# Altium integrated library Diodes.IntLib: 88 symbols
Pins are listed as number, name and electrical type; pins without a type are passive.

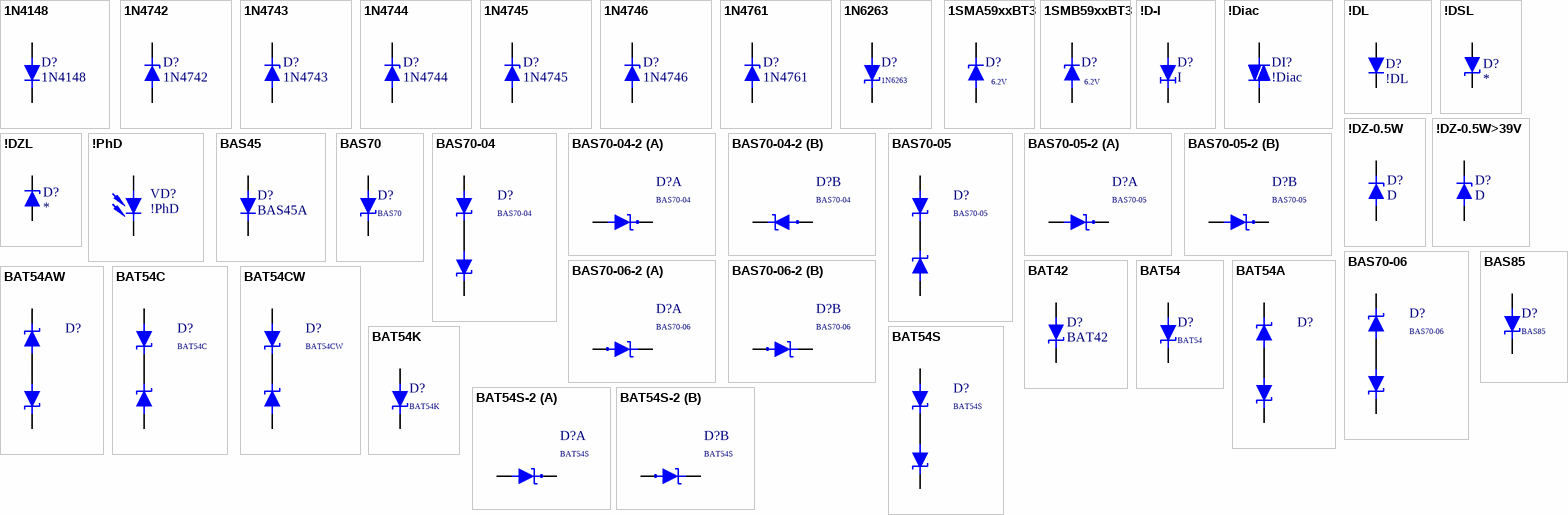
[diagram p0: symbols 1N4148 to BAT54S-2]

## 1N4148
designator D?
DO-35 75V 0.2A 1uS 4A 4nS; Price: 0.02
footprint DO-35-300
simulation model 1N4148 (Model Description)
signal-integrity model D (Model Description)
footprint DO-35-200
pins: 1 A, 2 C
1 alternate drawing of the same symbol

## 1N4742
designator D?
13V 1W; Price: 0.05
footprint DO-41-300
simulation model D1N4742 (Model Description)
signal-integrity model D (Model Description)
pins: 1 A, 2 C
1 alternate drawing of the same symbol

## 1N4743
designator D?
13V 1W; Price: 0.05
footprint DO-41-300
simulation model D1N4743 (Model Description)
signal-integrity model D (Model Description)
pins: 1 A, 2 C
1 alternate drawing of the same symbol

## 1N4744
designator D?
15V 1W; Price: 0.05
footprint DO-41-300
simulation model D1N4744 (Model Description)
signal-integrity model D (Model Description)
pins: 1 A, 2 C
1 alternate drawing of the same symbol

## 1N4745
designator D?
16V 1W; Price: 0.05
footprint DO-41-300
simulation model D1N4745 (Model Description)
signal-integrity model D (Model Description)
pins: 1 A, 2 C
1 alternate drawing of the same symbol

## 1N4746
designator D?
18V 1W; Price: 0.05
footprint DO-41-300
simulation model D1N4746 (Model Description)
signal-integrity model D (Model Description)
pins: 1 A, 2 C
1 alternate drawing of the same symbol

## 1N4761
designator D?
75V 1W; Price: 0.05
footprint DO-41-300
simulation model D1N4746 (Model Description)
signal-integrity model D (Model Description)
pins: 1 A, 2 C
1 alternate drawing of the same symbol

## 1N6263
designator D?
SMD-SOT123 60V 15mA 2.2pF 1nS; Price: 0.07
footprint SOD123
simulation model D1N6263W (Model Description)
signal-integrity model D (Model Description)
pins: 1 A, 2 C
1 alternate drawing of the same symbol

## 1SMA59xxBT3
designator D?, comment value 6.2V  (hidden comment: 1SMA5920BT3)
SMD-SMA 1.5W; Price: 0.08
footprint DO-214AC (SMA) (DO-214-AC/SMA; 2 C-Bend Leads; Body 5 x 2.7 mm, inc. leads (LxW))
signal-integrity model D (Model Description)
pins: 1 A, 2 C
1 alternate drawing of the same symbol

## 1SMB59xxBT3
designator D?, comment value 6.2V  (hidden comment: 1SMB5920BT3)
SMD-SMB 3W; Price: 0.08
footprint DO-214AA (SMB) (DO-214-AA/SMB; 2 C-Bend Leads; Body 5.3 x 3.6 mm, inc. leads (LxW))
signal-integrity model D (Model Description)
pins: 1 A, 2 C
1 alternate drawing of the same symbol

## !D-I
designator D?, comment I
Const I; Price: 0.02
footprint DO-35-300
signal-integrity model D (Model Description)
pins: 1 A, 2 C

## !Diac
designator DI?
*; Price: *
footprint DO-35-300
signal-integrity model D (Model Description)
pins: 1 A1 (hiz), 2 A2

## !DL
designator D?
*; Price: *
footprint DO-35-300
signal-integrity model D (Model Description)
pins: 1 A, 2 C

## !DSL
designator D?
Price: *
footprint DO-35-300
signal-integrity model D (Model Description)
pins: 1 A, 2 C

## !DZ-0.5W
designator D?, comment D
0.5W DO-35; Price: 0.044
footprint DO-35-300
signal-integrity model D (Model Description)
footprint DO-35-200
pins: 1 A, 2 C

## !DZ-0.5W>39V
designator D?, comment D
0.5W DO-35; Price: 0.083
footprint DO-35-300
signal-integrity model D (Model Description)
footprint DO-35-200
pins: 1 A, 2 C

## !DZL
designator D?
Price: *
footprint DO-35-300
signal-integrity model D (Model Description)
footprint DO-35-200
pins: 1 A, 2 C

## !PhD
designator VD?
PhotoDiod; Price: *
signal-integrity model D (Model Description)
pins: 1 A, 2 C
1 alternate drawing of the same symbol

## BAS45
designator D?, comment BAS45A
DO-35 125V 0.225A 4pF 1.5uS 1nA/125V; Price: 0.02
footprint DO-35-300
simulation model BAS45A (Model Description)
signal-integrity model D (Model Description)
footprint DO-35-200
pins: 1 A, 2 C

## BAS70
designator D?
SMD-SOT23 70V 0.2A 5nS; Price: 0.07
footprint SOT23
simulation model BAS70 (Model Description)
signal-integrity model D (Model Description)
pins: 1 A, 3 C
1 alternate drawing of the same symbol

## BAS70-04
designator D?
SMD-SOT23 70V 0.2A 5nS; Price: 0.08
footprint SOT23
simulation model BAS70-04 (Model Description)
signal-integrity model D (Model Description)
pins: 1 A, 2 C, 3 A/C
1 alternate drawing of the same symbol

## BAS70-04-2
designator D?, comment BAS70-04
SMD-SOT23 70V 0.2A 5nS; Price: 0.08
footprint SOT23
simulation model BAS70-04 (Model Description)
signal-integrity model D (Model Description)
part A pins: 1 A, 3 A-C
part B pins: 2 C, 3 A-C

## BAS70-05
designator D?
SMD-SOT23 70V 0.2A 5nS; Price: 0.08
footprint SOT23
simulation model BAS70-05 (Model Description)
signal-integrity model D (Model Description)
pins: 1 A, 2 A, 3 C
2 alternate drawings of the same symbol

## BAS70-05-2
designator D?, comment BAS70-05
SMD-SOT23 70V 0.2A 5nS; Price: 0.08
footprint SOT23
simulation model BAS70-05 (Model Description)
signal-integrity model D (Model Description)
part A pins: 1 A, 3 C
part B pins: 2 A, 3 C

## BAS70-06
designator D?
SMD-SOT23 70V 0.2A 5nS 5nA/70V; Price: 0.08
footprint SOT23
simulation model BAS70-06 (Model Description)
signal-integrity model D (Model Description)
pins: 1 C, 2 C, 3 A
1 alternate drawing of the same symbol

## BAS70-06-2
designator D?, comment BAS70-06
SMD-SOT23 70V 0.2A 5nS; Price: 0.08
footprint SOT23
simulation model BAS70-06 (Model Description)
signal-integrity model D (Model Description)
part A pins: 1 C, 3 A
part B pins: 2 C, 3 A

## BAS85
designator D?
SMD-SOT23 30V 0.2A 5nS; Price: 0.08
footprint SOD80/MLL34
simulation model BAT85 (Model Description)
signal-integrity model D (Model Description)
pins: 1 A, 2 C
1 alternate drawing of the same symbol

## BAT42
designator D?
DO-35 30V 0.2A 10mS 4A 5nS; Price: 0.11
footprint DO-35-300
simulation model BAT42 (Model Description)
signal-integrity model D (Model Description)
footprint DO-35-200
pins: 1 A, 2 C
1 alternate drawing of the same symbol

## BAT54
designator D?
SMD-SOT23 30V 0.2A 5nS 10pF; Price: 0.08
footprint SOT23
simulation model BAT54 (Model Description)
signal-integrity model D (Model Description)
pins: 1 A, 3 C
1 alternate drawing of the same symbol

## BAT54A
designator D?
SMD-SOT23 30V 0.2A 5nS 10pF; Price: 0.08
footprint SOT23
simulation model BAT54A (Model Description)
signal-integrity model D (Model Description)
pins: 1 C, 2 C, 3 A
1 alternate drawing of the same symbol

## BAT54AW
designator D?
SMD-SOT323 30V 0.2A 5nS 10pF; Price: 0.08
footprint SOT323 (SOT-323/SC-70; 3 Leads; Body 2.2 x 2.2 mm, inc. leads (LxW max))
simulation model BAT54A (Model Description)
signal-integrity model D (Model Description)
pins: 1 C, 2 C, 3 A
1 alternate drawing of the same symbol

## BAT54C
designator D?
SMD-SOT23 30V 0.2A 5nS 10pF; Price: 0.08
footprint SOT23
simulation model BAT54C (Model Description)
signal-integrity model D (Model Description)
pins: 1 A, 2 A, 3 C
2 alternate drawings of the same symbol

## BAT54CW
designator D?
SMD-SOT323 30V 0.2A 5nS 10pF; Price: 0.08
footprint SOT323 (SOT-323/SC-70; 3 Leads; Body 2.2 x 2.2 mm, inc. leads (LxW max))
simulation model BAT54C (Model Description)
signal-integrity model D (Model Description)
pins: 1 A, 2 A, 3 C
2 alternate drawings of the same symbol

## BAT54K
designator D?
SMD-SOD523 30V 0.2A 5nS 10pF; Price: 0.08
footprint SOD523
simulation model BAT54 (Model Description)
signal-integrity model D (Model Description)
pins: 1 A, 2 C
1 alternate drawing of the same symbol

## BAT54S
designator D?
SMD-SOT23 30V 0.2A 5nS 10pF; Price: 0.08
footprint SOT23
simulation model BAT54S (Model Description)
signal-integrity model D (Model Description)
pins: 1 A, 2 C, 3 A/C
1 alternate drawing of the same symbol

## BAT54S-2
designator D?, comment BAT54S
SMD-SOT23 70V 0.2A 5nS 10pF; Price: 0.08
footprint SOT23
simulation model BAT54S (Model Description)
signal-integrity model D (Model Description)
part A pins: 1 A, 3 A/C
part B pins: 2 C, 3 A/C

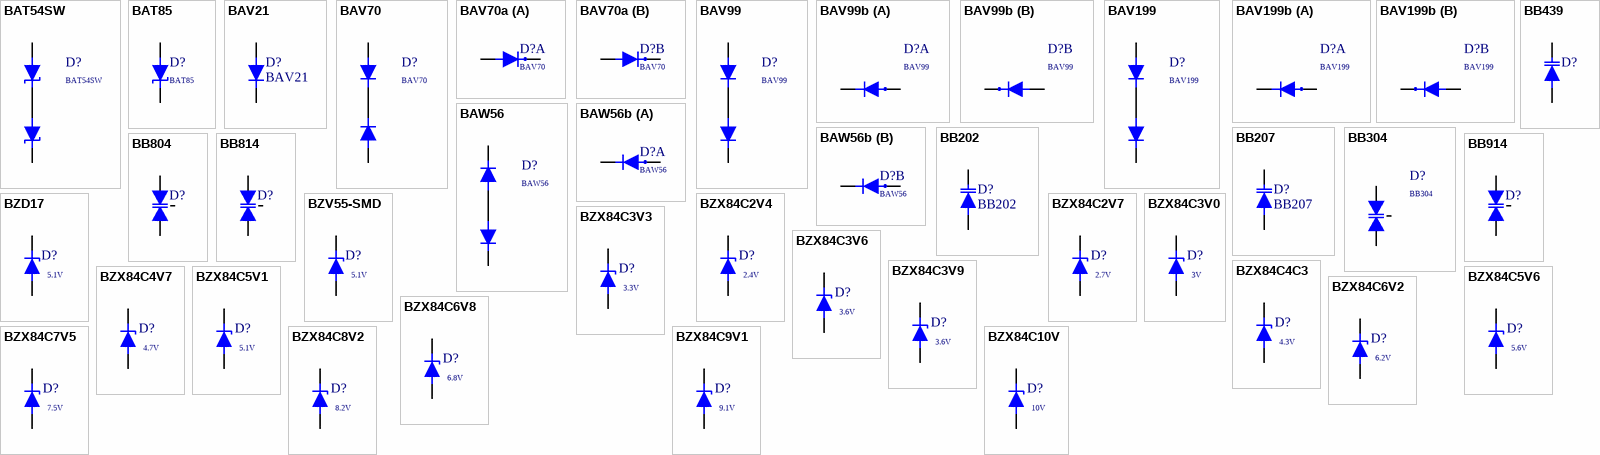
[diagram p1: symbols BAT54SW to BZX84C10V]

## BAT54SW
designator D?
SMD-SOT323 30V 0.2A 5nS 10pF; Price: 0.08
footprint SOT323 (SOT-323/SC-70; 3 Leads; Body 2.2 x 2.2 mm, inc. leads (LxW max))
simulation model BAT54S (Model Description)
signal-integrity model D (Model Description)
pins: 1 A, 2 C, 3 A/C
1 alternate drawing of the same symbol

## BAT85
designator D?
SMD-SOD80 30V 0.2A; Price: 0.09
footprint SOD80/MLL34
simulation model BAT85 (Model Description)
signal-integrity model D (Model Description)
pins: 1 A, 2 C
1 alternate drawing of the same symbol

## BAV21
designator D?
DO-35 220V 0.2A 1uS 4A 50nS; Price: 0.02
footprint DO-35-300
simulation model BAV21 (Model Description)
signal-integrity model D (Model Description)
footprint DO-35-200
pins: 1 A, 2 C
1 alternate drawing of the same symbol

## BAV70
designator D?
SMD-SOT23 75V 0.2A 6nS; Price: 0.07
footprint SOT23
simulation model BAV70 (Model Description)
signal-integrity model D (Model Description)
pins: 1 A, 2 A, 3 C
3 alternate drawings of the same symbol

## BAV70a
designator D?, comment BAV70
SMD-SOT23 75V 0.2A 6nS; Price: 0.07
footprint SOT23
simulation model BAV70 (Model Description)
signal-integrity model D (Model Description)
part A pins: 1 A, 3 C
part B pins: 2 A, 3 C

## BAV99
designator D?
SMD-SOT23 75V 0.2A 6nS; Price: 0.07
footprint SOT23
simulation model BAV99 (Model Description)
signal-integrity model D (Model Description)
pins: 1 A, 2 C, 3 A/C
5 alternate drawings of the same symbol

## BAV99b
designator D?, comment BAV99
SMD-SOT23 75V 0.2A 6nS; Price: 0.07
footprint SOT23
simulation model BAV99 (Model Description)
signal-integrity model D (Model Description)
part A pins: 2 C, 3 A/C
part B pins: 1 A, 3 A/C

## BAV199
designator D?
SMD-SOT23 75V 0.16A 3uS 2pF 5nA/75V max; Price: 0.07
footprint SOT23
simulation model BAV199 (Model Description)
signal-integrity model D (Model Description)
pins: 1 A, 2 C, 3 A/C
4 alternate drawings of the same symbol

## BAV199b
designator D?, comment BAV199
SMD-SOT23 75V 0.16A 3uS 2pF 5nA/75V max; Price: 0.07
footprint SOT23
simulation model BAV199 (Model Description)
signal-integrity model D (Model Description)
part A pins: 2 C, 3 A/C
part B pins: 1 A, 3 A/C

## BAW56
designator D?
SMD-SOT23 85V 0.2A 6nS; Price: 0.07
footprint SOT23
simulation model BAW56 (Model Description)
signal-integrity model D (Model Description)
pins: 1 C, 2 C, 3 A
3 alternate drawings of the same symbol

## BAW56b
designator D?, comment BAW56
SMD-SOT23 85V 0.2A 6nS; Price: 0.07
footprint SOT23
simulation model BAW56 (Model Description)
signal-integrity model D (Model Description)
part A pins: 1 C, 3 A
part B pins: 2 C, 3 A

## BB202
designator D?
6V  30.5p(0.2V) 2.3p(2.3V) 0.35om Ct 0.2/2.3 2.5; Price: 0.2
footprint SOD323
simulation model BB202 (Model Description)
signal-integrity model D (Model Description)
pins: 1 A, 2 C

## BB207
designator D?
15V  81p(1V) 27.6p(7.5V) 0.35om Ct 1/7.5 2.6; Price: 0.2
footprint SOD323
simulation model BB207 (Model Description)
signal-integrity model D (Model Description)
pins: 1 A, 2 C

## BB304
designator D?
2V 45pF C2/8 1.7; Price: 0.2
footprint DO92C
signal-integrity model D (Model Description)
pins: 1 A, 2 C, 3 A

## BB439
designator D?
28V  43p(1V) 5.1p(25V) 0.35om Ct 2/25 6.9; Price: 0.2
footprint SOD323
simulation model BB439 (Model Description)
signal-integrity model D (Model Description)
pins: 1 A, 2 C

## BB804
designator D?
18V  45p(2V)  0.18om Ct 2/8 1.71; Price: 0.2
footprint SOT23
simulation model BB804 (Model Description)
signal-integrity model D (Model Description)
pins: 1 A, 2 A, 3 C

## BB814
designator D?
18V  45p(2V) 20.8p(8V) 0.18om Ct 2/8 2.15 dC3%; Price: 0.2
footprint SOT23
simulation model BB814 (Model Description)
signal-integrity model D (Model Description)
pins: 1 A, 2 A, 3 C

## BB914
designator D?
18V  43.75p(2V) 18.7p(8V) 0.28om Ct 2/8 2.34 dC1.5%; Price: 0.2
footprint SOT23
simulation model BB914 (Model Description)
signal-integrity model D (Model Description)
pins: 1 A, 2 A, 3 C

## BZD17
designator D?, comment 5.1V
BZD17  SMD-SMA 0.8W; Price: 0.08; Value: 5.1V
footprint DO-214AC (SMA) (DO-214-AC/SMA; 2 C-Bend Leads; Body 5 x 2.7 mm, inc. leads (LxW))
signal-integrity model D (Model Description)
pins: 1 A, 2 C
1 alternate drawing of the same symbol

## BZV55-SMD
designator D?, comment 5.1V
BZV55 SMD-SOD80C  0.5W; Price: 0.08; Value: 5.1V
footprint SOD80/MLL34
signal-integrity model D (Model Description)
pins: 1 A, 2 C
1 alternate drawing of the same symbol

## BZX84C2V4
designator D?, comment 2.4V
0,5W 2.4V; Price: 0.044; Value: 2.4V
footprint DO-35-300
simulation model BZX84C2V4 (Model Description)
signal-integrity model D (Model Description)
footprint DO-35-200
pins: 1 A, 2 C
1 alternate drawing of the same symbol

## BZX84C2V7
designator D?, comment 2.7V
0,5W 2.7V; Price: 0.044; Value: 2.7V
footprint DO-35-300
simulation model BZX84C2V7 (Model Description)
signal-integrity model D (Model Description)
footprint DO-35-200
pins: 1 A, 2 C
1 alternate drawing of the same symbol

## BZX84C3V0
designator D?, comment 3V
0,5W 3.0V; Price: 0.044; Value: 3V
footprint DO-35-300
simulation model BZX84C3V0 (Model Description)
signal-integrity model D (Model Description)
footprint DO-35-200
pins: 1 A, 2 C
1 alternate drawing of the same symbol

## BZX84C3V3
designator D?, comment 3.3V
0,5W 3.3V; Price: 0.044; Value: 3.3V
footprint DO-35-300
simulation model BZX84C3V3 (Model Description)
signal-integrity model D (Model Description)
footprint DO-35-200
pins: 1 A, 2 C
1 alternate drawing of the same symbol

## BZX84C3V6
designator D?, comment 3.6V
0,5W 3.6V; Price: 0.044; Value: 3.6V
footprint DO-35-300
simulation model BZX84C3V6 (Model Description)
signal-integrity model D (Model Description)
footprint DO-35-200
pins: 1 A, 2 C
1 alternate drawing of the same symbol

## BZX84C3V9
designator D?, comment 3.6V
0,5W 3.9V; Price: 0.044; Value: 3.6V
footprint DO-35-300
simulation model BZX84C3V9 (Model Description)
signal-integrity model D (Model Description)
footprint DO-35-200
pins: 1 A, 2 C
1 alternate drawing of the same symbol

## BZX84C4C3
designator D?, comment 4.3V
0,5W 4.3V; Price: 0.044; Value: 4.3V
footprint DO-35-300
simulation model BZX84C4V3 (Model Description)
signal-integrity model D (Model Description)
footprint DO-35-200
pins: 1 A, 2 C
1 alternate drawing of the same symbol

## BZX84C4V7
designator D?, comment 4.7V
0,5W 4.7V; Price: 0.044; Value: 4.7V
footprint DO-35-300
simulation model BZX84C4V7 (Model Description)
signal-integrity model D (Model Description)
footprint DO-35-200
pins: 1 A, 2 C
1 alternate drawing of the same symbol

## BZX84C5V1
designator D?, comment 5.1V
0,5W 5.1V; Price: 0.044; Value: 5.1V
footprint DO-35-300
simulation model BZX84C5V1 (Model Description)
signal-integrity model D (Model Description)
footprint DO-35-200
pins: 1 A, 2 C
1 alternate drawing of the same symbol

## BZX84C5V6
designator D?, comment 5.6V
0,5W 5.6V; Price: 0.044; Value: 5.6V
footprint DO-35-300
simulation model BZX84C5V6 (Model Description)
signal-integrity model D (Model Description)
footprint DO-35-200
pins: 1 A, 2 C
1 alternate drawing of the same symbol

## BZX84C6V2
designator D?, comment 6.2V
0,5W 6.2V; Price: 0.044; Value: 6.2V
footprint DO-35-300
simulation model BZX84C6V2 (Model Description)
signal-integrity model D (Model Description)
footprint DO-35-200
pins: 1 A, 2 C
1 alternate drawing of the same symbol

## BZX84C6V8
designator D?, comment 6.8V
0,5W 6.8V; Price: 0.044; Value: 6.8V
footprint DO-35-300
simulation model BZX84C6V8 (Model Description)
signal-integrity model D (Model Description)
footprint DO-35-200
pins: 1 A, 2 C
1 alternate drawing of the same symbol

## BZX84C7V5
designator D?, comment 7.5V
0,5W 7.5V; Price: 0.044; Value: 7.5V
footprint DO-35-300
simulation model BZX84C7V5 (Model Description)
signal-integrity model D (Model Description)
footprint DO-35-200
pins: 1 A, 2 C
1 alternate drawing of the same symbol

## BZX84C8V2
designator D?, comment 8.2V
0,5W 8.2V; Price: 0.044; Value: 8.2V
footprint DO-35-300
simulation model BZX84C8V2 (Model Description)
signal-integrity model D (Model Description)
footprint DO-35-200
pins: 1 A, 2 C
1 alternate drawing of the same symbol

## BZX84C9V1
designator D?, comment 9.1V
0,5W 9.1V; Price: 0.044; Value: 9.1V
footprint DO-35-300
simulation model BZX84C9V1 (Model Description)
signal-integrity model D (Model Description)
footprint DO-35-200
pins: 1 A, 2 C
1 alternate drawing of the same symbol

## BZX84C10V
designator D?, comment 10V
0,5W 10V; Price: 0.044; Value: 10V
footprint DO-35-300
simulation model BZX84C10V (Model Description)
signal-integrity model D (Model Description)
footprint DO-35-200
pins: 1 A, 2 C
1 alternate drawing of the same symbol

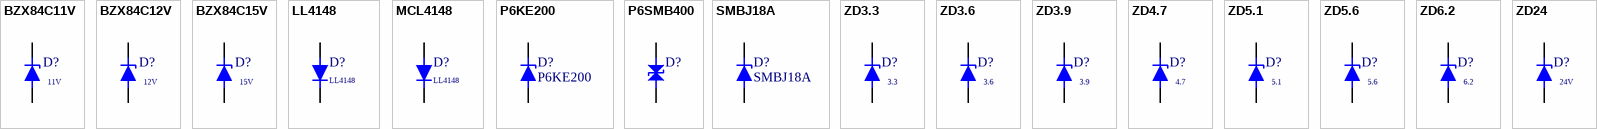
[diagram p2: symbols BZX84C11V to ZD24]

## BZX84C11V
designator D?, comment 11V
0,5W 11V; Price: 0.044; Value: 11V
footprint DO-35-300
simulation model BZX84C11V (Model Description)
signal-integrity model D (Model Description)
footprint DO-35-200
pins: 1 A, 2 C
1 alternate drawing of the same symbol

## BZX84C12V
designator D?, comment 12V
0,5W 12V; Price: 0.044; Value: 12V
footprint DO-35-300
simulation model BZX84C12V (Model Description)
signal-integrity model D (Model Description)
footprint DO-35-200
pins: 1 A, 2 C
1 alternate drawing of the same symbol

## BZX84C15V
designator D?, comment 15V
0,5W 15V; Price: 0.044; Value: 15V
footprint DO-35-300
simulation model BZX84C15V (Model Description)
signal-integrity model D (Model Description)
footprint DO-35-200
pins: 1 A, 2 C
1 alternate drawing of the same symbol

## LL4148
designator D?
75V 0.3A SOD80/MLL34; Price: 0.006
footprint SOD80/MLL34
simulation model 1N4148 (Model Description)
signal-integrity model D (Model Description)
pins: 1 A, 2 C
1 alternate drawing of the same symbol

## MCL4148
designator D?, comment LL4148
SMD Micro-Melf 75V 0.3A; Price: 0.006
footprint Micro-Melf
simulation model 1N4148 (Model Description)
signal-integrity model D (Model Description)
pins: 1 A, 2 C
1 alternate drawing of the same symbol

## P6KE200
designator D?
TVS DO-15 600W 200V; Price: 0.29
footprint DO-15-400
signal-integrity model D (Model Description)
pins: 1 A, 2 C
1 alternate drawing of the same symbol

## P6SMB400
designator D?
TVS SMB 600W 400V; Price: 1
footprint DO-214AA (SMB) (DO-214-AA/SMB; 2 C-Bend Leads; Body 5.3 x 3.6 mm, inc. leads (LxW))
signal-integrity model D (Model Description)
pins: 1 A, 2 C
1 alternate drawing of the same symbol

## SMBJ18A
designator D?
TVS SMB 600W 18V; Price: 0.29
footprint DO-214AA (SMB) (DO-214-AA/SMB; 2 C-Bend Leads; Body 5.3 x 3.6 mm, inc. leads (LxW))
signal-integrity model D (Model Description)
pins: 1 A, 2 C
1 alternate drawing of the same symbol

## ZD3.3
designator D?, comment 3.3
3.3V 0.2W; Price: 0.1; Value: 3.3
footprint SOD323
signal-integrity model D (Model Description)
pins: 1 A, 2 C
1 alternate drawing of the same symbol

## ZD3.6
designator D?, comment 3.6
3.6V 0.2W; Price: 0.1; Value: 3.6
footprint SOD323
signal-integrity model D (Model Description)
pins: 1 A, 2 C
1 alternate drawing of the same symbol

## ZD3.9
designator D?, comment 3.9
3.9V 0.2W; Price: 0.1; Value: 3.9
footprint SOD323
signal-integrity model D (Model Description)
pins: 1 A, 2 C
1 alternate drawing of the same symbol

## ZD4.7
designator D?, comment 4.7
4.7V 0.2W; Price: 0.1; Value: 4.7
footprint SOD323
signal-integrity model D (Model Description)
pins: 1 A, 2 C
1 alternate drawing of the same symbol

## ZD5.1
designator D?, comment 5.1
5.1V 0.2W; Price: 0.1; Value: 5.1
footprint SOD323
signal-integrity model D (Model Description)
pins: 1 A, 2 C
1 alternate drawing of the same symbol

## ZD5.6
designator D?, comment 5.6
5.6V 0.2W; Price: 0.1; Value: 5.6
footprint SOD323
signal-integrity model D (Model Description)
pins: 1 A, 2 C
1 alternate drawing of the same symbol

## ZD6.2
designator D?, comment 6.2
6.2V 0.2W; Price: 0.1; Value: 6.2
footprint SOD323
signal-integrity model D (Model Description)
pins: 1 A, 2 C
1 alternate drawing of the same symbol

## ZD24
designator D?, comment 24V
ZD24 0.2W; Price: 0.1; Value: 24V
footprint SOD323
signal-integrity model D (Model Description)
pins: 1 A, 2 C
1 alternate drawing of the same symbol